# Altium footprint library Main_Board.PcbLib: 106 footprints (part 7 of 7)
Each footprint in its own frame and in the unit in brackets; x right, y up, seen from the top. Pads: shape width x height; smd on the part's side, far side on the other; paste and mask are expansions set on the pad; w line width, h text height; cw(c..) or ccw(c..) is an arc to the next point about the centre after c.
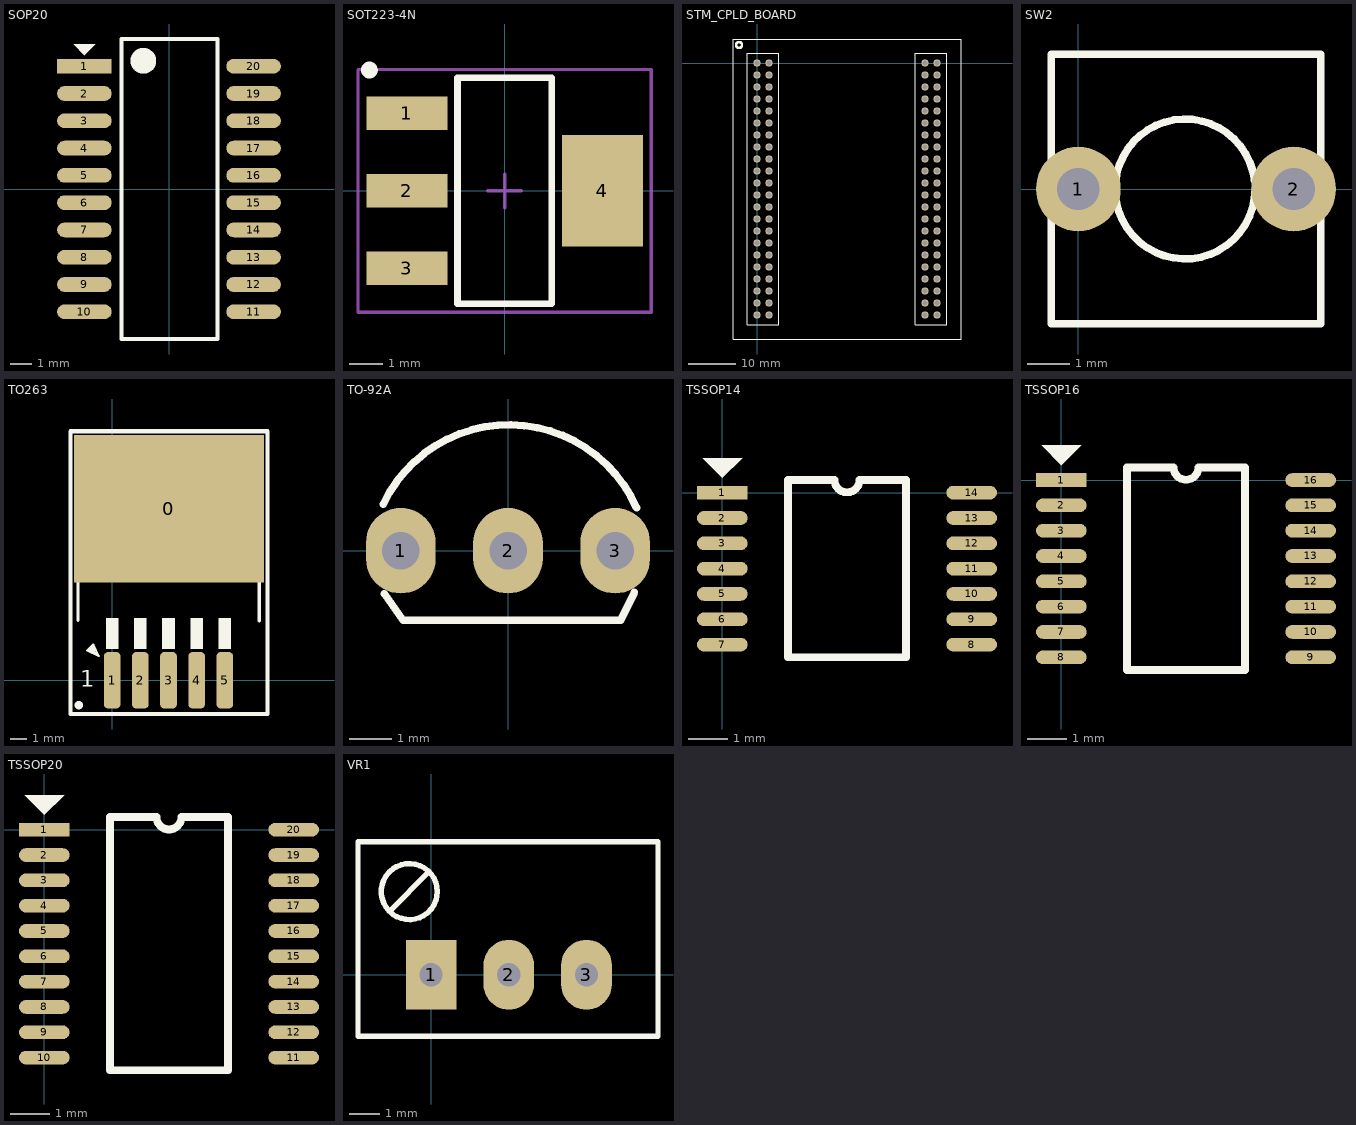
[diagram p6: the footprints below, top view; thin cyan lines are the x and y axes]

## SOP20 [mil] "SOP, 20-Leads, Body 13.4x6.2mm, Pitch 1.27mm, IPC Low Density"
height 78.74
pads (20):
  rect 100x27 smd: 1(-155,225)
  oval 100x27 smd: 2(-155,175) 3(-155,125) 4(-155,75) 5(-155,25) 6(-155,-25) 7(-155,-75) 8(-155,-125) 9(-155,-175) 10(-155,-225) 11(155,-225) 12(155,-175) 13(155,-125) 14(155,-75) 15(155,-25) 16(155,25) 17(155,75) 18(155,125) 19(155,175) 20(155,225)
Top Overlay:
  circle w23.62: c-47,235 r11.81
  region: -175,265 -135,265 -155,245
  lines w8: -87,-275 -87,275 89,275 89,-275 -87,-275
3D body: height 78.74, standoff 0, extent -130.44,-275 132,275

## SOT223-4N [mm] "SOT223, 4-Leads, Body 6.5x3.5mm, Pitch 2.3mm, Lead Span 7mm, IPC Medium Density"
height 1.8
pads (4):
  rect 2.4x1 smd: 1(-2.9,2.3) 2(-2.9,0) 3(-2.9,-2.3)
  rect 2.4x3.3 smd: 4(2.9,0)
Top Overlay:
  circle w0.25: c-4.013,3.581 r0.125
  lines w0.2: -1.4,-3.35 1.4,-3.35 1.4,3.35 -1.4,3.35 -1.4,-3.35
Mechanical 15:
  lines w0.1: -0.5,0 0.5,0 ; 0,-0.5 0,0.5 ; -4.35,-3.6 4.35,-3.6 4.35,3.6 -4.35,3.6 -4.35,-3.6
3D body: height 1.72, standoff 0.02, extent -3.395,-3.274 3.496,3.226

## STM_CPLD_BOARD [mil] "Stm32f4 and Max2 520 on one board"
height 300
pads (88):
  round 60 hole 40: 1(0,0) 2(0,-100) 3(0,-200) 4(0,-300) 5(0,-400) 6(0,-500) 7(0,-600) 8(0,-700) 9(0,-800) 10(0,-900) 11(0,-1000) 12(0,-1100) 13(0,-1200) 14(0,-1300) 15(0,-1400) 16(0,-1500) 17(0,-1600) 18(0,-1700) 19(0,-1800) 20(0,-1900) 21(0,-2000) 22(0,-2100) 23(100,-2100) 24(100,-2000) 25(100,-1900) 26(100,-1800) 27(100,-1700) 28(100,-1600) 29(100,-1500) 30(100,-1400) 31(100,-1300) 32(100,-1200) 33(100,-1100) 34(100,-1000) 35(100,-900) 36(100,-800) 37(100,-700) 38(100,-600) 39(100,-500) 40(100,-400) 41(100,-300) 42(100,-200) 43(100,-100) 44(100,0) 45(1400,0) 46(1400,-100) 47(1400,-200) 48(1400,-300) 49(1400,-400) 50(1400,-500) 51(1400,-600) 52(1400,-700) 53(1400,-800) 54(1400,-900) 55(1400,-1000) 56(1400,-1100) 57(1400,-1200) 58(1400,-1300) 59(1400,-1400) 60(1400,-1500) 61(1400,-1600) 62(1400,-1700) 63(1400,-1800) 64(1400,-1900) 65(1400,-2000) 66(1400,-2100) 67(1500,-2100) 68(1500,-2000) 69(1500,-1900) 70(1500,-1800) 71(1500,-1700) 72(1500,-1600) 73(1500,-1500) 74(1500,-1400) 75(1500,-1300) 76(1500,-1200) 77(1500,-1100) 78(1500,-1000) 79(1500,-900) 80(1500,-800) 81(1500,-700) 82(1500,-600) 83(1500,-500) 84(1500,-400) 85(1500,-300) 86(1500,-200) 87(1500,-100) 88(1500,0)
Top Overlay:
  circle w20: c-150,150 r25
  lines w10: -200,-2300 -200,200 1700,200 1700,-2300 -200,-2300 ; -80,-2180 -80,80 180,80 180,-2180 -80,-2180 ; 1320,-2180 1580,-2180 1580,80 1320,80 1320,-2180

## SW2 [mm] "SW button 2pin, 250x 250 mil"
height 2.54
pads (2):
  round 2 hole 1: 1(0,0) 2(5.08,0)
Top Overlay:
  lines w0.178: 4.157,0.21 ccw(c2.519,0) 4.17,0 ; -0.635,-3.175 5.715,-3.175 5.715,3.175 -0.635,3.175 -0.635,-3.175
3D body: height 4.2, standoff -2, extent -0.51,-3.052 5.59,3.048

## TO263 [mm]
pads (6):
  rect 11.43x8.89 smd: 0(3.429,10.338)
  rrect50% 1x3.4 smd: 1(0,0) 2(1.7,0) 4(5.1,0) 5(6.8,0)
  rrect50% 1x3.4 smd mask+0: 3(3.4,0)
Top Overlay:
  circle w0.25: c-2.007,-1.499 r0.125
  rectangle: 6.421,1.879 7.179,3.759
  rectangle: 4.721,1.879 5.479,3.759
  rectangle: 3.021,1.879 3.779,3.759
  rectangle: 1.321,1.879 2.079,3.759
  rectangle: -0.379,1.879 0.379,3.759
  lines w0.127: -1.325,1.976 -0.806,1.456 ; -1.325,1.976 -1.517,1.786 -0.806,1.456 ; -1.325,1.976 -1.136,2.167 -0.806,1.456
  lines w0.178: -1.339,1.837 -1.161,1.659 ; -1.186,1.99 -1.009,1.812
  lines w0.2: -2.057,3.607 -2.057,12.539 -2.057,13.886 -0.707,14.681 7.402,14.681 8.865,13.82 8.865,12.624 8.865,3.573 8.865,12.412 -2.057,12.412 -2.057,3.607
  lines w0.254: -2.515,-2.032 9.375,-2.032 9.375,15.011 -2.515,15.011 -2.515,-2.032
  text "1" at -1.93,-0.381 h1
Top Solder:
  rectangle: -2.193,6.883 8.932,14.046
  lines w0.254: -2.02,14.481 -0.539,14.904 ; 8.743,14.481 7.262,14.904 ; 8.912,13.868 9.039,13.741 9.039,6.756 8.404,6.756 -2.254,6.756 -2.259,6.762 -2.259,12.412 -2.259,13.682 ; 8.982,12.412 8.982,13.682 ; -2.259,13.682 cw(c-1.93,13.682) -2.021,13.998 ccw(c-1.93,13.682) -2.259,13.682 ; -0.449,14.917 ccw(c-0.449,14.588) -0.539,14.904 cw(c-0.449,14.588) -0.449,14.917 ; -0.449,14.917 7.171,14.917 ; 7.171,14.917 cw(c7.171,14.588) 7.261,14.904 ; 7.171,14.917 cw(c7.171,14.588) 7.261,14.904 ; 8.982,13.682 ccw(c8.653,13.682) 8.743,13.998 cw(c8.653,13.682) 8.982,13.682
  lines w0.508: -1.253,14.063 7.993,14.063
3D body: height 4.57, standoff -0.01, extent -1.676,-0.856 8.484,13.785

## TO-92A [mil] "TO-92"
height 200
pads (3):
  oval 65x80 hole 35: 1(-100,0) 2(0,0) 3(100,0)
Top Overlay:
  lines w7: -116.52,43.21 cw(c0.97,-12.43) 119.94,39.97 ; -115.34,-40.24 -98,-65 105,-65 118,-39
3D body: height 245.04, standoff -199.79, extent -108.87,-65.56 108.86,95

## TSSOP14 [mm]
pads (14):
  rect 1.3x0.35 smd: 1(0,0)
  oval 1.3x0.35 smd: 2(0,-0.65) 3(0,-1.3) 4(0,-1.95) 5(0,-2.6) 6(0,-3.25) 7(0,-3.9) 8(6.4,-3.9) 9(6.4,-3.25) 10(6.4,-2.6) 11(6.4,-1.95) 12(6.4,-1.3) 13(6.4,-0.65) 14(6.4,0)
Top Overlay:
  region: -0.508,0.889 0.508,0.889 0,0.381
  lines w0.2: 2.875,0.325 1.685,0.325 1.685,-4.225 4.715,-4.225 4.715,0.325 3.525,0.325 ; 2.882,0.325 ccw(c3.2,0.325) 3.517,0.325
3D body: height 1.2, standoff 0, extent -0.026,-4.506 6.374,0.594

## TSSOP16 [mm]
pads (16):
  rect 1.3x0.35 smd: 1(0,0)
  oval 1.3x0.35 smd: 2(0,-0.65) 3(0,-1.3) 4(0,-1.95) 5(0,-2.6) 6(0,-3.25) 7(0,-3.9) 8(0,-4.55) 9(6.4,-4.55) 10(6.4,-3.9) 11(6.4,-3.25) 12(6.4,-2.6) 13(6.4,-1.95) 14(6.4,-1.3) 15(6.4,-0.65) 16(6.4,0)
Top Overlay:
  region: -0.508,0.889 0.508,0.889 0,0.381
  lines w0.2: 2.875,0.325 1.685,0.325 1.685,-4.875 4.715,-4.875 4.715,0.325 3.525,0.325 ; 2.883,0.325 ccw(c3.2,0.325) 3.518,0.325
3D body: height 1.1, standoff 0, extent 0,-4.775 6.4,0.225

## TSSOP20 [mm]
pads (20):
  rect 1.3x0.35 smd: 1(0,0)
  oval 1.3x0.35 smd: 2(0,-0.65) 3(0,-1.3) 4(0,-1.95) 5(0,-2.6) 6(0,-3.25) 7(0,-3.9) 8(0,-4.55) 9(0,-5.2) 10(0,-5.85) 11(6.4,-5.85) 12(6.4,-5.2) 13(6.4,-4.55) 14(6.4,-3.9) 15(6.4,-3.25) 16(6.4,-2.6) 17(6.4,-1.95) 18(6.4,-1.3) 19(6.4,-0.65) 20(6.4,0)
Top Overlay:
  region: -0.508,0.889 0.508,0.889 0,0.381
  lines w0.2: 2.875,0.325 1.685,0.325 1.685,-6.175 4.715,-6.175 4.715,0.325 3.525,0.325 ; 2.883,0.325 ccw(c3.2,0.325) 3.518,0.325
3D body: height 1, standoff 0, extent 0.02,-6.175 6.43,0.325

## VR1 [mil] "Variable Resistor"
height 400
pads (3):
  rect 65x90 hole 30: 1(0,0)
  oval 65x90 hole 30: 2(100,0) 3(200,0)
Top Overlay:
  circle w7: c-28,107 r36.06
  lines w7: -53,82 -3,132 ; -94,-79 292,-79 292,171 -94,171 -94,-79
3D body: height 455, standoff -45, extent -88.5,-74 286.5,166